# Altium footprint library 2.52-直插元件.PcbLib: 467 footprints (part 16 of 30)
Each footprint in its own frame and in the unit in brackets; x right, y up, seen from the top. Pads: shape width x height; smd on the part's side, far side on the other; paste and mask are expansions set on the pad; w line width, h text height; cw(c..) or ccw(c..) is an arc to the next point about the centre after c.
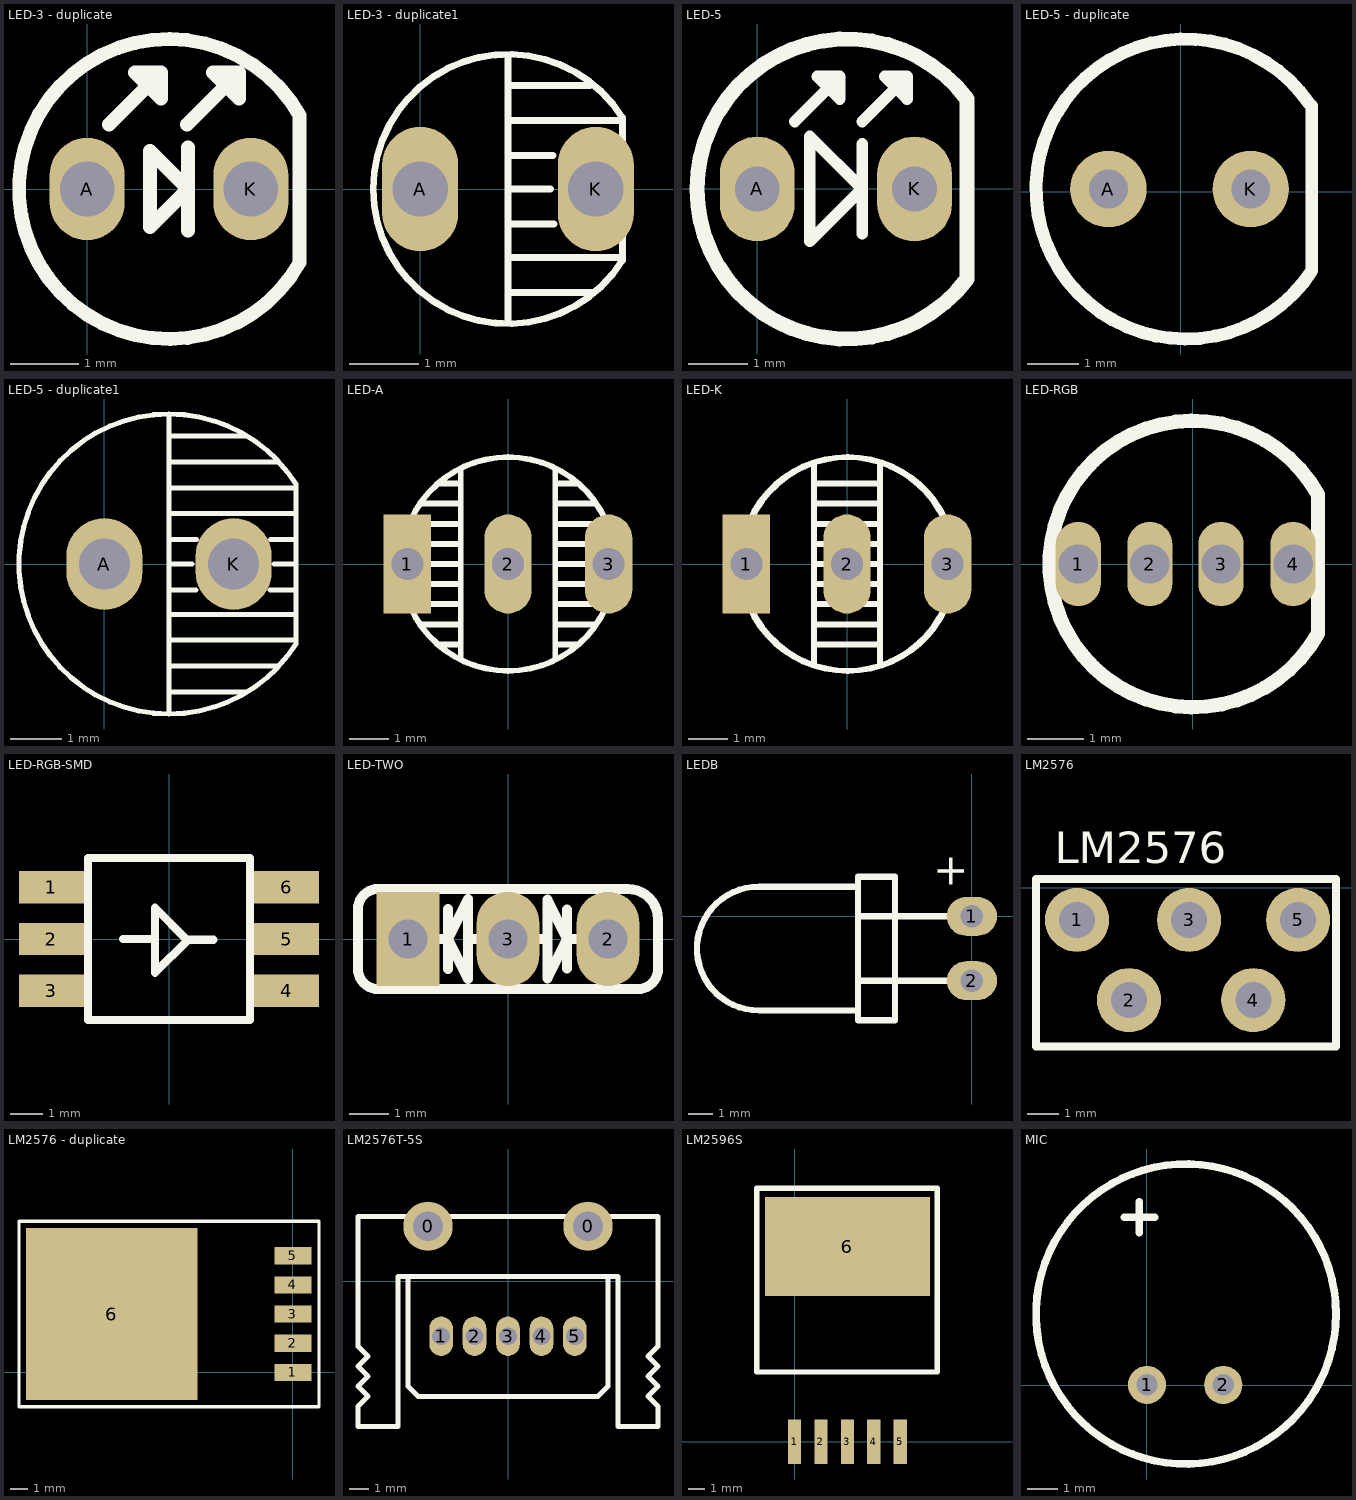
[diagram p15: the footprints below, top view; thin cyan lines are the x and y axes]

## LED-3 - duplicate [mm]
pads (2):
  oval 1.1x1.5 hole 0.8: A(0,0) K(2.4,0)
Top Overlay:
  lines w0.203: 0.322,0.946 1.084,1.708 ; 1.465,0.946 2.227,1.708 ; 1.479,-0.61 1.479,0.61 ; 3.116,-1.073 3.116,1.082 ccw(c1.2,0) 3.119,-1.076 ; 1.084,1.708 1.084,1.327 0.703,1.708 1.084,1.708 ; 2.227,1.708 1.846,1.708 2.227,1.327 2.227,1.708 ; 0.921,-0.559 0.921,0.559 1.479,0 0.921,-0.559

## LED-3 - duplicate1 [mm] "淘宝ID:黄晶宝石   店铺网址:https://shop463601444.taobao.com"
pads (2):
  oval 1.1x1.8 hole 0.8: A(0,0) K(2.54,0)
Top Overlay:
  lines w0.1: 1.27,-1.937 1.27,1.936 ; 1.27,0 1.887,0 ; 1.27,0.991 2.924,0.991 ; 1.27,1.499 2.456,1.499 ; 1.295,-1.499 2.505,-1.499 ; 1.295,-0.991 2.924,-0.991 ; 1.295,-0.508 1.933,-0.508 ; 1.295,0.483 1.922,0.483 ; 2.924,-1.033 cw(c1.27,0) 2.924,1.033 2.924,-1.033
3D body "SW3DPS-LED DIP 3MM-DEFAULT.step": height 5.5, standoff -3, extent -0.628,-1.9 2.872,1.9

## LED-5 [mil] "淘宝ID:黄晶宝石"
pads (2):
  oval 50x70 hole 30: A(0,0) K(105,0)
Top Overlay:
  lines w7.78: 25,45 55,75 ; 70,-30 70,30 ; 70,45 100,75 ; 55,75 40,75 55,60 55,75 ; 100,75 85,75 100,60 100,75 ; 35,-35 70,0 35,35 35,-35
  lines w10: 140,-60.15 cw(c59.9,-0.07) 140,60 140,-60.15

## LED-5 - duplicate [mm]
pads (2):
  round 1.5 hole 0.762: A(-1.416,0.054) K(1.378,0.054)
Top Overlay:
  lines w0.254: 2.525,1.738 ccw(c0.108,0.054) 2.578,-1.551 2.578,1.685

## LED-5 - duplicate1 [mm]
pads (2):
  oval 1.5x1.8 hole 1: A(0,0) K(2.54,0)
Top Overlay:
  lines w0.1: 1.27,-2.934 1.27,2.929 ; 1.27,0 1.724,0 ; 1.27,0.991 3.771,0.991 ; 1.27,1.499 3.772,1.499 ; 1.27,2.007 3.401,2.007 ; 1.27,2.515 2.801,2.515 ; 1.295,-2.515 2.806,-2.515 ; 1.295,-2.007 3.426,-2.007 ; 1.295,-1.499 3.77,-1.499 ; 1.295,-0.991 3.77,-0.991 ; 1.295,-0.508 1.805,-0.508 ; 1.295,0.483 1.812,0.483 ; 3.258,-0.508 3.77,-0.508 ; 3.267,0.483 3.771,0.484 ; 3.339,-0.003 3.771,-0.003 ; 3.77,-1.563 3.772,1.563 ccw(c1.27,0) 3.772,-1.563
3D body "User Library-LEDd5B.STEP": height 12.31, standoff -2.49, extent -1.664,-3.01 3.756,3.01

## LED-A [mm]
pads (3):
  rect 1.2x2.5 hole 0.8: 1(-2.54,0)
  oval 1.2x2.5 hole 0.8: 2(0,0) 3(2.54,0)
Top Overlay:
  circle w0.15: c0.005,0 r2.7
  lines w0.15: -2.692,0 -1.194,0 ; -2.642,-0.508 -1.194,-0.508 ; -2.642,0.508 -1.194,0.508 ; -2.489,-1.016 -1.219,-1.016 ; -2.489,1.016 -1.219,1.016 ; -2.21,-1.524 -1.219,-1.524 ; -2.21,1.524 -1.219,1.524 ; -1.727,-2.032 -1.219,-2.032 ; -1.727,2.032 -1.219,2.032 ; -1.194,-2.413 -1.194,2.413 ; 1.194,-2.413 1.194,2.413 ; 1.194,-0.508 2.642,-0.508 ; 1.194,0 2.692,0 ; 1.194,0.508 2.642,0.508 ; 1.219,-2.032 1.727,-2.032 ; 1.219,-1.524 2.21,-1.524 ; 1.219,-1.016 2.489,-1.016 ; 1.219,1.016 2.489,1.016 ; 1.219,1.524 2.21,1.524 ; 1.219,2.032 1.727,2.032
3D body "User Library-5mmBiColorLED.step": height 10.81, standoff -2.63, extent -2.866,-2.946 2.875,2.946

## LED-K [mm]
pads (3):
  rect 1.2x2.5 hole 0.8: 1(-2.54,0)
  oval 1.2x2.5 hole 0.8: 2(0,0) 3(2.54,0)
Top Overlay:
  circle w0.15: c0.03,0 r2.7
  circle w0.15: c0.005,0 r2.7
  lines w0.15: -0.838,-2.54 -0.838,2.54 ; -0.838,-2.032 0.838,-2.032 ; -0.838,-1.524 0.838,-1.524 ; -0.838,-1.016 0.838,-1.016 ; -0.838,-0.508 0.838,-0.508 ; -0.838,0 0.838,0 ; -0.838,0.508 0.838,0.508 ; -0.838,1.016 0.838,1.016 ; -0.838,1.524 0.838,1.524 ; -0.838,2.032 0.838,2.032 ; 0.838,-2.54 0.838,2.54
3D body "User Library-led 5mm 3 pin.step": height 12, standoff -4, extent -2.967,-2.9 2.976,2.9

## LED-RGB [mm] "三基色二极管"
height 6
pads (4):
  oval 0.8x1.5 hole 0.7: 1(-2.032,0) 2(-0.762,0) 3(0.5,0) 4(1.778,0)
Top Overlay:
  lines w0.254: 2.22,-1.234 cw(c0,0) 2.22,1.234 2.22,-1.234

## LED-RGB-SMD [mm]
pads (6):
  rect 2x1 smd: 1(-3.632,1.6) 2(-3.632,0) 3(-3.632,-1.6) 4(3.632,-1.6) 5(3.632,0) 6(3.632,1.6)
Top Overlay:
  lines w0.254: -1.422,0 -0.432,0 ; 1.372,-0.025 0.584,-0.025 ; 0.584,-0.025 -0.432,-1.041 -0.432,0.965 0.559,-0.025 0.584,-0.025 ; -2.5,-2.5 2.5,-2.5 2.5,2.5 -2.5,2.5 -2.5,-2.5

## LED-TWO [mm]
pads (3):
  rect 1.6x2.4 hole 1: 1(-2.54,0)
  oval 1.6x2.4 hole 1: 2(2.54,0) 3(0,0)
Top Overlay:
  lines w0.254: -2.032,0 -1.524,0 ; -1.524,-0.762 -1.524,0.762 ; -1.016,0 -0.508,0 ; 0.762,0 1,0 ; 1.496,-0.754 1.496,0.746 ; 2.032,0 1.5,0 ; -1.524,0 -1.016,-1.016 -1.016,1.016 -1.524,0 ; 1,1 1,-1 1.5,0 ; 1,1 1.5,0 ; 1,1 1.5,0 ; -3.81,-0.762 ccw(c-3.302,-0.762) -3.302,-1.27 3.302,-1.27 ccw(c3.302,-0.762) 3.81,-0.762 3.81,0.508 ccw(c3.048,0.508) 3.048,1.27 -3.302,1.27 ccw(c-3.302,0.762) -3.81,0.762 -3.81,-0.762

## LEDB [mil]
pads (2):
  oval 80x62 hole 36: 1(0,0) 2(0,-102.36)
Top Overlay:
  lines w10: -181.1,-149.61 -338.58,-149.61 cw(c-338.58,-51.18) -338.58,47.25 -181.1,47.24 ; -181.1,-102.36 -122.05,-102.36 -27.56,-102.36 ; -181.1,0 -122.05,0 -27.56,0 ; -125.98,-165.35 -181.1,-165.35 -181.1,62.99 -122.05,62.99 -122.05,-165.35
  text "+" at -11.81,43.31 h50

## LM2576 [mil]
pads (5):
  round 80 hole 45: 1(-759.76,-40) 2(-695,-140) 3(-620,-40) 4(-540,-140) 5(-484.17,-40)
Top Overlay:
  lines w10: -810.95,-197.79 -436.93,-197.79 -436.93,11.18 -810.95,11.18 -810.95,-197.79
  text "LM2576" at -787.32,30.87 h39.37

## LM2576 - duplicate [mm]
pads (6):
  rect 2.16x1 smd: 1(0.003,-0.02) 2(0.003,1.68) 3(0.003,3.38) 4(0.003,5.08) 5(0.003,6.78)
  rect 10x10 smd: 6(-10.547,3.38)
Top Overlay:
  lines w0.2: -5.601,-2.016 -15.951,-2.016 -15.951,8.784 -5.541,8.784
  lines w0.203: -5.601,-2.016 1.524,-2.016 1.524,8.784 -5.541,8.784

## LM2576T-5S [mm]
pads (7):
  round 2.5 hole 1.5: 0(-4.064,2.794) 0(4.064,2.794)
  oval 1.2x2 hole 0.9: 1(-3.4,-2.794) 2(-1.7,-2.794) 3(0,-2.794) 4(1.7,-2.794) 5(3.4,-2.794)
Top Overlay:
  lines w0.254: -5.08,0.254 -5.08,-0.254 -5.08,-5.334 -4.572,-5.842 4.572,-5.842 5.08,-5.334 5.08,-0.254 5.08,0.254 ; -7.62,-7.366 -5.588,-7.366 -5.588,0.254 5.588,0.254 5.588,-7.366 7.62,-7.366 7.62,-6.35 7.112,-5.842 7.62,-5.334 7.112,-4.826 7.62,-4.318 7.112,-3.81 7.62,-3.302 7.62,3.302 -7.62,3.302 -7.62,-3.302 -7.112,-3.81 -7.62,-4.318 -7.112,-4.826 -7.62,-5.334 -7.112,-5.842 -7.62,-6.35 -7.62,-7.366

## LM2596S [mm]
pads (6):
  rect 0.8x2.7 smd: 1(0,0) 2(1.6,0) 3(3.2,0) 4(4.8,0) 5(6.4,0)
  rect 10x6 smd: 6(3.2,11.8)
Top Overlay:
  lines w0.305: -2.286,4.208 8.636,4.208 8.636,15.333 -2.286,15.333 -2.286,4.208
Bottom Paste:
  lines w0.254: -1.8,4.25 8.2,4.25

## MIC [mil]
pads (2):
  round 50 hole 28: 1(0.42,0.29) 2(100.42,0.29)
Top Overlay:
  circle w10: c51.58,93.29 r196.85
  lines w10: -29.58,220.29 10.42,220.29 ; -9.58,200.29 -9.58,240.29